# Altium footprint library Inductors SMD.PcbLib: 145 footprints (part 8 of 10)
Each footprint in its own frame and in the unit in brackets; x right, y up, seen from the top. Pads: shape width x height; smd on the part's side, far side on the other; paste and mask are expansions set on the pad; w line width, h text height; cw(c..) or ccw(c..) is an arc to the next point about the centre after c.
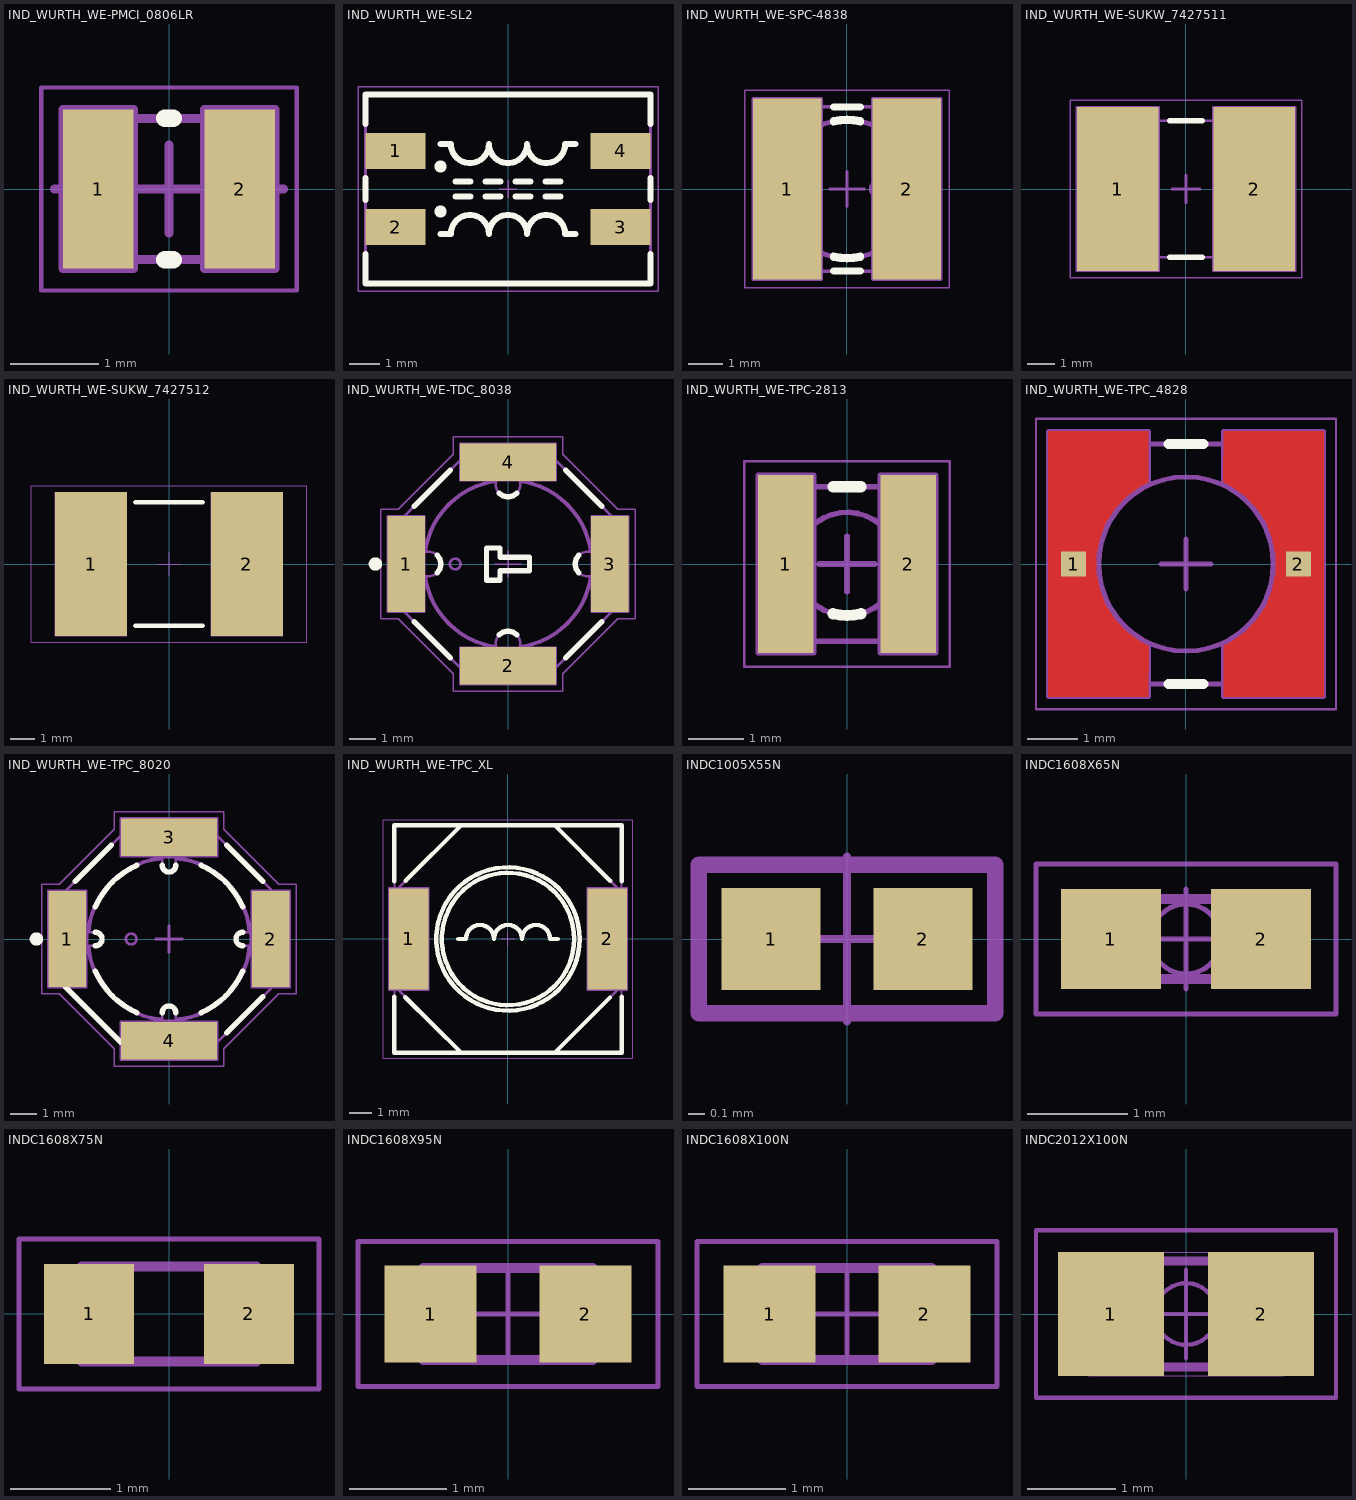
[diagram p7: the footprints below, top view; thin cyan lines are the x and y axes]

## IND_WURTH_WE-PMCI_0806LR [mm] "SMD Power Molded Chip  Inductor (WE-PMCI Series), Body 2.0x1.6mm"
height 1
pads (2):
  rect 0.8x1.8 smd: 1(-0.8,0) 2(0.8,0)
Top Overlay:
  lines w0.2: -0.05,-0.8 0.05,-0.8 ; -0.05,0.8 0.05,0.8
Mechanical 8:
  lines w0.1: -1.3,0 -0.8,0 ; -0.8,-0.5 -0.8,0 ; -0.8,0.5 -0.8,0 ; -0.5,0 0,0 ; -0.3,0 -0.8,0 ; 0,-0.5 0,0 ; 0,0.5 0,0 ; 0.3,0 0.8,0 ; 0.5,0 0,0 ; 0.8,-0.5 0.8,0 ; 0.8,0.5 0.8,0 ; 1.3,0 0.8,0 ; -1.2,-0.9 -0.4,-0.9 -0.4,0.9 -1.2,0.9 -1.2,-0.9 ; 0.4,-0.9 1.2,-0.9 1.2,0.9 0.4,0.9 0.4,-0.9
Mechanical 14:
  lines w0.1: -0.5,-0.8 0.5,-0.8 ; -0.5,-0.8 -1,-0.8 -1,0.8 -0.5,0.8 ; -0.5,-0.8 -0.5,0.8 ; -0.5,0.8 0.5,0.8 ; 0.5,-0.8 0.5,0.8 ; 0.5,-0.8 1,-0.8 1,0.8 0.5,0.8
Mechanical 15:
  lines w0.05: -1.45,-1.15 1.45,-1.15 1.45,1.15 -1.45,1.15 -1.45,-1.15
3D body "IND_WURTH_WE-PMCI_0806LR.stp": height 1, standoff 0, extent -1,-0.8 1,0.8

## IND_WURTH_WE-SL2 [mm] "Common Mode SMD Line Filter WE-SL2"
height 1.45
pads (4):
  rect 2x1.2 smd: 1(-3.75,1.27) 2(-3.75,-1.27) 3(3.75,-1.27) 4(3.75,1.27)
Top Overlay:
  circle w0.2: c-2.25,-0.75 r0.1
  circle w0.2: c-2.25,0.75 r0.1
  lines w0.2: -4.75,-2.175 -4.75,-3.15 4.75,-3.15 4.75,-2.175 ; -4.75,-0.365 -4.75,0.365 ; -4.75,2.175 -4.75,3.15 4.75,3.15 4.75,2.175 ; -2.25,-1.5 -1.905,-1.5 cw(c-1.27,-1.5) -0.635,-1.5 cw(c0,-1.5) 0.635,-1.5 cw(c1.27,-1.5) 1.905,-1.5 2.25,-1.5 ; -2.25,1.5 -1.905,1.5 ccw(c-1.27,1.5) -0.635,1.5 ccw(c0,1.5) 0.635,1.5 ccw(c1.27,1.5) 1.905,1.5 2.25,1.5 ; -1.75,-0.25 -1.25,-0.25 ; -1.75,0.25 -1.25,0.25 ; -0.75,-0.25 -0.25,-0.25 ; -0.75,0.25 -0.25,0.25 ; 0.25,-0.25 0.75,-0.25 ; 0.25,0.25 0.75,0.25 ; 1.25,-0.25 1.75,-0.25 ; 1.25,0.25 1.75,0.25 ; 4.75,-0.365 4.75,0.365
Mechanical 14:
  circle w0.1: c-2.25,-0.75 r0.1
  circle w0.1: c-2.25,0.75 r0.1
  lines w0.1: -2.25,-1.5 -1.905,-1.5 cw(c-1.27,-1.5) -0.635,-1.5 cw(c0,-1.5) 0.635,-1.5 cw(c1.27,-1.5) 1.905,-1.5 2.25,-1.5 ; -2.25,1.5 -1.905,1.5 ccw(c-1.27,1.5) -0.635,1.5 ccw(c0,1.5) 0.635,1.5 ccw(c1.27,1.5) 1.905,1.5 2.25,1.5 ; -1.75,-0.25 -1.25,-0.25 ; -1.75,0.25 -1.25,0.25 ; -0.75,-0.25 -0.25,-0.25 ; -0.75,0.25 -0.25,0.25 ; 0.25,-0.25 0.75,-0.25 ; 0.25,0.25 0.75,0.25 ; 1.25,-0.25 1.75,-0.25 ; 1.25,0.25 1.75,0.25 ; -4.75,-3.15 -4.75,3.15 4.75,3.15 4.75,-3.15 -4.75,-3.15
Mechanical 15:
  lines w0.05: -0.3,0 0.3,0 ; 0,-0.3 0,0.3 ; -5,-3.4 -5,3.4 5,3.4 5,-3.4 -5,-3.4
3D body "IND_WURTH_WE-SL2.stp": height 5.3, standoff 0, extent -4.749,-3.149 4.751,3.151

## IND_WURTH_WE-SPC-4838 [mm] "SMD Inductor, Body 4.8x4.8mm"
height 9.1
pads (2):
  rect 2x5.3 smd: 1(-1.75,0) 2(1.75,0)
Top Overlay:
  lines w0.2: -0.4,-2.41 0.4,-2.41 ; -0.4,-2.011 ccw(c0,0) 0.4,-2.011 ; -0.4,-1.96 ccw(c0,0) 0.4,-1.96 ; -0.4,1.96 cw(c0,0) 0.4,1.96 ; -0.4,2.011 cw(c0,0) 0.4,2.011 ; -0.4,2.41 0.4,2.41
Mechanical 8:
  lines w0.1: -2.25,0 -1.75,0 ; -1.75,-0.5 -1.75,0 ; -1.75,0.5 -1.75,0 ; -1.25,0 -1.75,0 ; -0.5,0 0,0 ; 0,-0.5 0,0 ; 0,0.5 0,0 ; 0.5,0 0,0 ; 1.25,0 1.75,0 ; 1.75,-0.5 1.75,0 ; 1.75,0.5 1.75,0 ; 2.25,0 1.75,0 ; -2.75,-2.65 -2.75,2.65 -0.75,2.65 -0.75,-2.65 -2.75,-2.65 ; 0.75,-2.65 0.75,2.65 2.75,2.65 2.75,-2.65 0.75,-2.65
Mechanical 14:
  circle w0.1: c0.944,0 r0.25
  circle w0.1: c0,0 r2.05
  lines w0.1: -2.41,-2.21 ccw(c-2.21,-2.21) -2.21,-2.41 1.2,-2.41 ccw(c1.2,-1.9) 1.671,-2.096 cw(c2.4,-2.4) 2.096,-1.671 ccw(c1.9,-1.2) 2.41,-1.2 2.41,2.21 ccw(c2.21,2.21) 2.21,2.41 -1.2,2.41 ccw(c-1.2,1.9) -1.671,2.096 cw(c-2.4,2.4) -2.096,1.671 ccw(c-1.9,1.2) -2.41,1.2 -2.41,-2.21 ; -1.751,-0.966 cw(c0,0) 0.966,1.751 cw(c0.869,1.576) 1.011,1.435 ccw(c1.202,1.203) 1.414,0.99 cw(c1.575,0.867) 1.751,0.966 cw(c0,0) -0.966,-1.751 cw(c-0.867,-1.575) -0.99,-1.414 ccw(c-1.202,-1.202) -1.414,-0.99 cw(c-1.575,-0.867) -1.751,-0.966
Mechanical 15:
  lines w0.05: -3,-2.9 -3,2.9 3,2.9 3,-2.9 -3,-2.9
3D body "IND_WURTH_WE-SPC-4838.stp": height 3.81, standoff 0, extent -2.41,-2.41 2.41,2.41

## IND_WURTH_WE-SUKW_7427511 [mm] "WE-SUKW SMD EMI Suppression 5-Hole Ferrite Bead, Body 8x5mm"
height 5.1
pads (2):
  rect 3x6 smd: 1(-2.5,0) 2(2.5,0)
Top Overlay:
  lines w0.2: -0.6,-2.5 0.6,-2.5 ; -0.6,2.5 0.6,2.5
Mechanical 8:
  lines w0.1: -3,0 -2.5,0 ; -2.5,-0.5 -2.5,0 ; -2.5,0.5 -2.5,0 ; -2,0 -2.5,0 ; -0.5,0 0,0 ; 0,-0.5 0,0 ; 0,0.5 0,0 ; 0.5,0 0,0 ; 2,0 2.5,0 ; 2.5,-0.5 2.5,0 ; 2.5,0.5 2.5,0 ; 3,0 2.5,0 ; -4,-3 -4,3 -1,3 -1,-3 -4,-3 ; 1,-3 1,3 4,3 4,-3 1,-3
Mechanical 14:
  drawing of 3064 lines, arcs and shapes, not listed
Mechanical 15:
  lines w0.05: -4.25,-3.25 4.25,-3.25 4.25,3.25 -4.25,3.25 -4.25,-3.25
3D body "IND_WURTH_WE-SUKW_7427511.stp": height 4.85, standoff 0, extent -4,-2.625 4,2.625

## IND_WURTH_WE-SUKW_7427512 [mm] "WE-SUKW SMD EMI Suppression 5-Hole Ferrite Bead, Body 11x4.65mm"
height 5.5
pads (2):
  rect 3x6 smd: 1(-3.25,0) 2(3.25,0)
Top Overlay:
  lines w0.2: -1.4,-2.575 1.4,-2.575 ; -1.4,2.575 1.4,2.575
Mechanical 8:
  lines w0.05: -3.75,0 -3.25,0 ; -3.25,-0.5 -3.25,0 ; -3.25,0.5 -3.25,0 ; -2.75,0 -3.25,0 ; -0.5,0 0,0 ; 0,-0.5 0,0 ; 0,0.5 0,0 ; 0.5,0 0,0 ; 2.75,0 3.25,0 ; 3.25,-0.5 3.25,0 ; 3.25,0.5 3.25,0 ; 3.75,0 3.25,0 ; -4.75,-3 -1.75,-3 -1.75,3 -4.75,3 -4.75,-3 ; 1.75,-3 4.75,-3 4.75,3 1.75,3 1.75,-3
Mechanical 15:
  lines w0.05: -5.75,-3.25 -5.75,3.25 5.75,3.25 5.75,-3.25 -5.75,-3.25
3D body "IND_WURTH_WE-SUKW_7427512.stp": height 5.25, standoff 0, extent -5.499,-2.575 5.5,2.575

## IND_WURTH_WE-TDC_8038 [mm] "Common Mode SMD, Shielded Coupled Inductor (WE-TDC Serie), Body 8x8mm H 4.1mm"
height 4.1
pads (4):
  rect 1.4x3.6 smd: 1(-3.8,0) 3(3.8,0)
  rect 3.6x1.4 smd: 2(0,-3.8) 4(0,3.8)
Top Overlay:
  circle w0.25: c-4.95,0 r0.125
  lines w0.2: -3.507,-2.15 -2.15,-3.507 ; -3.507,2.15 -2.15,3.507 ; -2.645,-0.327 ccw(c-2.972,0) -2.645,0.327 ; -0.327,-2.645 cw(c0,-2.972) 0.327,-2.645 ; -0.327,2.645 ccw(c0,2.972) 0.327,2.645 ; 2.15,-3.507 3.507,-2.15 ; 2.15,3.507 3.507,2.15 ; 2.645,-0.327 cw(c2.972,0) 2.645,0.327 ; -0.8,-0.6 -0.8,0.6 -0.3,0.6 -0.3,0.25 0.8,0.25 0.8,-0.25 -0.3,-0.25 -0.3,-0.6 -0.8,-0.6
Mechanical 8:
  lines w0.05: -4.3,0 -3.8,0 ; -3.8,-0.5 -3.8,0 ; -3.8,0.5 -3.8,0 ; -3.3,0 -3.8,0 ; -0.5,-3.8 0,-3.8 ; -0.5,0 0,0 ; -0.5,3.8 0,3.8 ; 0,-4.3 0,-3.8 ; 0,-3.3 0,-3.8 ; 0,-0.5 0,0 ; 0,0.5 0,0 ; 0,3.3 0,3.8 ; 0,4.3 0,3.8 ; 0.5,-3.8 0,-3.8 ; 0.5,0 0,0 ; 0.5,3.8 0,3.8 ; 3.3,0 3.8,0 ; 3.8,-0.5 3.8,0 ; 3.8,0.5 3.8,0 ; 4.3,0 3.8,0 ; -4.5,-1.8 -4.5,1.8 -3.1,1.8 -3.1,-1.8 -4.5,-1.8 ; -1.8,-4.5 1.8,-4.5 1.8,-3.1 -1.8,-3.1 -1.8,-4.5 ; -1.8,3.1 1.8,3.1 1.8,4.5 -1.8,4.5 -1.8,3.1 ; 3.1,-1.8 3.1,1.8 4.5,1.8 4.5,-1.8 3.1,-1.8
Mechanical 14:
  circle w0.1: c-1.972,0 r0.2
  circle w0.1: c0,0 r3.157
  lines w0.1: -4,-1.657 -1.657,-4 1.657,-4 4,-1.657 4,1.657 1.657,4 -1.657,4 -4,1.657 -4,-1.657 ; -3.077,-0.45 ccw(c0.001,0.001) -0.45,-3.077 cw(c0,-2.972) 0.45,-3.077 ccw(c-0.001,0.001) 3.077,-0.45 cw(c2.972,0) 3.077,0.45 ccw(c-0.002,-0.002) 0.45,3.077 cw(c0,2.972) -0.45,3.077 ccw(c0.002,-0.002) -3.077,0.45 cw(c-2.972,0) -3.077,-0.45 ; -0.8,-0.6 -0.8,0.6 -0.3,0.6 -0.3,0.25 0.8,0.25 0.8,-0.25 -0.3,-0.25 -0.3,-0.6 -0.8,-0.6
Mechanical 15:
  lines w0.05: -4.75,-2.05 -4.75,2.05 -4.104,2.05 -2.05,4.104 -2.05,4.75 2.05,4.75 2.05,4.104 4.104,2.05 4.75,2.05 4.75,-2.05 4.104,-2.05 2.05,-4.104 2.05,-4.75 -2.05,-4.75 -2.05,-4.104 -4.104,-2.05 -4.75,-2.05
3D body "IND_WURTH_WE-TDC_8038.stp": height 3.8, standoff 0, extent -4,-4 4,4

## IND_WURTH_WE-TPC-2813 [mm] "Shielded Tiny Power Inductor, Body 2.8x2.8mm"
height 1.5
pads (2):
  rect 1x3.2 smd: 1(-1.1,0) 2(1.1,0)
Top Overlay:
  lines w0.2: -0.25,-0.896 ccw(c0,0) 0.25,-0.896 ; -0.25,1.39 0.25,1.39
Mechanical 8:
  lines w0.1: -1.6,0 -1.1,0 ; -1.1,-0.5 -1.1,0 ; -1.1,0.5 -1.1,0 ; -0.6,0 -1.1,0 ; -0.5,0 0,0 ; 0,-0.5 0,0 ; 0,0.5 0,0 ; 0.5,0 0,0 ; 0.6,0 1.1,0 ; 1.1,-0.5 1.1,0 ; 1.1,0.5 1.1,0 ; 1.6,0 1.1,0 ; -1.6,-1.6 -1.6,1.6 -0.6,1.6 -0.6,-1.6 -1.6,-1.6 ; 0.6,-1.6 0.6,1.6 1.6,1.6 1.6,-1.6 0.6,-1.6
Mechanical 14:
  circle w0.1: c0,0 r0.93
  lines w0.1: -1.39,-0.576 -0.576,-1.39 0.576,-1.39 1.39,-0.576 1.39,0.576 0.576,1.39 -0.576,1.39 -1.39,0.576 -1.39,-0.576
Mechanical 15:
  lines w0.05: -1.85,-1.85 1.85,-1.85 1.85,1.85 -1.85,1.85 -1.85,-1.85
3D body "IND_WURTH_WE-TPC-2813.stp": height 1.2, standoff 0, extent -1.39,-1.39 1.39,1.39

## IND_WURTH_WE-TPC_4828 [mm] "Shielded Tiny Power Inductor, Body 4.8x4.8mm"
height 2.8
pads (2):
  rect 0.5x0.5 smd: 1(-2.247,0) 2(2.247,0)
Top Layer:
  region: -2.75,-2.65 -0.75,-2.65 -0.75,-1.636 -0.902,-1.558 -1.18,-1.359 -1.416,-1.112 -1.6,-0.824 -1.727,-0.507 -1.792,-0.171 -1.792,0.171 -1.727,0.507 -1.6,0.824 -1.416,1.112 -1.18,1.359 -0.902,1.558 -0.75,1.636 -0.75,2.65 -2.75,2.65
  region: 0.75,-2.65 2.75,-2.65 2.75,2.65 0.75,2.65 0.75,1.636 0.902,1.558 1.18,1.359 1.416,1.112 1.6,0.824 1.727,0.507 1.792,0.171 1.792,-0.171 1.727,-0.507 1.6,-0.824 1.416,-1.112 1.18,-1.359 0.902,-1.558 0.75,-1.636
Top Overlay:
  lines w0.2: -0.35,-2.4 0.35,-2.4 ; -0.35,2.4 0.35,2.4
Mechanical 8:
  lines w0.1: -2.747,0 -2.247,0 ; -2.247,-0.5 -2.247,0 ; -2.247,0.5 -2.247,0 ; -1.747,0 -2.247,0 ; -0.5,0 0,0 ; 0,-0.5 0,0 ; 0,0.5 0,0 ; 0.5,0 0,0 ; 1.747,0 2.247,0 ; 2.247,-0.5 2.247,0 ; 2.247,0.5 2.247,0 ; 2.747,0 2.247,0 ; -2.75,-2.65 -0.75,-2.65 -0.75,-1.636 cw(c0,0) -0.75,1.636 -0.75,2.65 -2.75,2.65 -2.75,-2.65 ; 0.75,-2.65 2.75,-2.65 2.75,2.65 0.75,2.65 0.75,1.636 cw(c0,0) 0.75,-1.636 0.75,-2.65
Mechanical 14:
  circle w0.1: c0,0 r1.744
  lines w0.1: -2.4,-2.4 -2.4,2.4 2.4,2.4 2.4,-2.4 -2.4,-2.4
Mechanical 15:
  lines w0.05: -3,-2.9 3,-2.9 3,2.9 -3,2.9 -3,-2.9
3D body "IND_WURTH_WE-TPC-4828.stp": height 2.8, standoff 0, extent -2.4,-2.4 2.4,2.4

## IND_WURTH_WE-TPC_8020 [mm] "Power Choke Inductor, Body 8x8mm"
height 2
pads (4):
  rect 1.4x3.6 smd: 1(-3.8,0) 2(3.8,0)
  rect 3.6x1.4 smd: 3(0,3.8) 4(0,-3.8)
Top Overlay:
  circle w0.25: c-4.95,0 r0.125
  lines w0.2: -3.857,-1.8 -1.8,-3.857 ; -3.507,2.15 -2.15,3.507 ; -2.75,-1.199 ccw(c0,0) -1.199,-2.75 ; -2.75,-0.25 ccw(c-2.75,0) -2.75,0.25 ; -2.75,1.199 cw(c0,0) -1.199,2.75 ; -0.25,-2.75 cw(c0,-2.75) 0.25,-2.75 ; -0.25,2.75 ccw(c0,2.75) 0.25,2.75 ; 1.199,-2.75 ccw(c0,0) 2.75,-1.199 ; 1.199,2.75 cw(c0,0) 2.75,1.199 ; 2.15,-3.507 3.507,-2.15 ; 2.15,3.507 3.507,2.15 ; 2.75,-0.25 cw(c2.75,0) 2.75,0.25
Mechanical 8:
  lines w0.1: -4.3,0 -3.8,0 ; -3.8,-0.5 -3.8,0 ; -3.8,0.5 -3.8,0 ; -3.3,0 -3.8,0 ; -0.5,-3.8 0,-3.8 ; -0.5,0 0,0 ; -0.5,3.8 0,3.8 ; 0,-4.3 0,-3.8 ; 0,-3.3 0,-3.8 ; 0,-0.5 0,0 ; 0,0.5 0,0 ; 0,3.3 0,3.8 ; 0,4.3 0,3.8 ; 0.5,-3.8 0,-3.8 ; 0.5,0 0,0 ; 0.5,3.8 0,3.8 ; 3.3,0 3.8,0 ; 3.8,-0.5 3.8,0 ; 3.8,0.5 3.8,0 ; 4.3,0 3.8,0 ; -4.5,-1.8 -3.1,-1.8 -3.1,1.8 -4.5,1.8 -4.5,-1.8 ; -1.8,-4.5 -1.8,-3.1 1.8,-3.1 1.8,-4.5 -1.8,-4.5 ; -1.8,3.1 -1.8,4.5 1.8,4.5 1.8,3.1 -1.8,3.1 ; 3.1,-1.8 4.5,-1.8 4.5,1.8 3.1,1.8 3.1,-1.8
Mechanical 14:
  circle w0.1: c0,0 r3.05
  circle w0.1: c-1.415,0 r0.2
  lines w0.1: -4,-1.657 -4,1.657 -1.657,4 1.657,4 4,1.657 4,-1.657 1.657,-4 -1.657,-4 -4,-1.657 ; -2.99,-0.25 ccw(c0,0) -0.25,-2.99 -0.25,-2.75 cw(c0,-2.75) 0.25,-2.75 0.25,-2.99 ccw(c0,0) 2.99,-0.25 2.75,-0.25 cw(c2.75,0) 2.75,0.25 2.99,0.25 ccw(c0,0) 0.25,2.99 0.25,2.75 cw(c0,2.75) -0.25,2.75 -0.25,2.99 ccw(c0,0) -2.99,0.25 -2.75,0.25 cw(c-2.75,0) -2.75,-0.25 -2.99,-0.25
Mechanical 15:
  lines w0.05: -4.75,-2.05 -4.104,-2.05 -2.05,-4.104 -2.05,-4.75 2.05,-4.75 2.05,-4.104 4.104,-2.05 4.75,-2.05 4.75,2.05 4.104,2.05 2.05,4.104 2.05,4.75 -2.05,4.75 -2.05,4.104 -4.104,2.05 -4.75,2.05 -4.75,-2.05
3D body "IND_WURTH_WE-TPC-8020.stp": height 1.8, standoff 0, extent -4,-4 4,4

## IND_WURTH_WE-TPC_XL [mm] "Shielded Tiny Power Inductor, Body 10.3x10.3mm"
height 3.1
pads (2):
  rect 1.8x4.6 smd: 1(-4.5,0) 2(4.5,0)
Top Overlay:
  circle w0.2: c0,0 r3
  circle w0.2: c0,0 r3.25
  lines w0.2: -5.15,-2.625 -5.15,-5.15 5.15,-5.15 5.15,-2.625 ; -5.15,2.625 -5.15,5.15 5.15,5.15 5.15,2.625 ; -4.658,-2.642 -2.133,-5.15 ; -4.633,2.65 -2.133,5.15 ; -2.25,0 -1.905,0 cw(c-1.27,0) -0.635,0 cw(c0,0) 0.635,0 cw(c1.27,0) 1.905,0 2.25,0 ; 2.133,-5.15 4.625,-2.65 ; 2.133,5.15 4.629,2.646
Mechanical 8:
  lines w0.1: -5.4,-2.3 -5.4,2.3 -3.6,2.3 -3.6,-2.3 -5.4,-2.3 ; 3.6,-2.3 3.6,2.3 5.4,2.3 5.4,-2.3 3.6,-2.3
Mechanical 14:
  circle w0.1: c0,0 r3.25
  circle w0.1: c0,0 r3
  lines w0.1: -5.15,-2.133 -2.133,-5.15 ; -5.15,2.133 -2.133,5.15 ; -2.25,0 -1.905,0 cw(c-1.27,0) -0.635,0 cw(c0,0) 0.635,0 cw(c1.27,0) 1.905,0 2.25,0 ; 2.133,-5.15 5.15,-2.133 ; 2.133,5.15 5.15,2.133 ; -5.15,-5.15 5.15,-5.15 5.15,5.15 -5.15,5.15 -5.15,-5.15
Mechanical 15:
  lines w0.05: -0.3,0 0.3,0 ; 0,-0.3 0,0.3 ; -5.65,-5.4 5.65,-5.4 5.65,5.4 -5.65,5.4 -5.65,-5.4
3D body "IND_WURTH_WE-TPC-XL.stp": height 3.1, standoff 0, extent -5.155,-5.155 5.145,5.145

## INDC1005X55N [mm] "Chip Inductor, 2-Leads, EIA 0402, Metric 1005, Body 1x0.5mm, 0402IPC Medium Density"
height 0.55
pads (2):
  rect 0.6x0.62 smd: 1(-0.46,0) 2(0.46,0)
Mechanical 14:
  lines w0.1: -0.9,-0.45 0.9,-0.45 0.9,0.45 -0.9,0.45 -0.9,-0.45
Mechanical 15:
  lines w0.05: -0.5,0 0.5,0 ; 0,-0.5 0,0.5 ; -0.91,-0.46 0.91,-0.46 0.91,0.46 -0.91,0.46 -0.91,-0.46
3D body "INDC1005X55N.stp": height 0.55, standoff 0, extent -0.525,-0.275 0.525,0.275

## INDC1608X65N [mm] "Chip Inductor, 2-Leads, EIA 0603, Metric 1608, Body 1.6x0.8mm, IPC Medium Density"
height 0.65
pads (2):
  rect 1x1 smd: 1(-0.75,0) 2(0.75,0)
Mechanical 14:
  lines w0.1: -0.8,-0.4 -0.8,0.4 0.8,0.4 0.8,-0.4 -0.8,-0.4
Mechanical 15:
  circle w0.05: c0,0 r0.35
  lines w0.05: -0.5,0 0.5,0 ; 0,-0.5 0,0.5 ; -1.5,-0.75 -1.5,0.75 1.5,0.75 1.5,-0.75 -1.5,-0.75
3D body "INDC1608X65N.stp": height 0.65, standoff 0, extent -0.875,-0.475 0.875,0.475

## INDC1608X75N [mm] "Chip Inductor, 2-Leads, EIA 0603, Metric 1608, Body 1.6x0.8mm, IPC Medium Density"
height 0.75
pads (2):
  rect 0.9x1 smd: 1(-0.8,0) 2(0.8,0)
Mechanical 8:
  lines w0.025: -0.575,-0.475 -0.575,0.475 ; 0.575,-0.475 0.575,0.475 ; -0.875,-0.475 0.875,-0.475 0.875,0.475 -0.875,0.475 -0.875,-0.475
Mechanical 14:
  lines w0.1: -0.875,-0.475 -0.875,0.475 0.875,0.475 0.875,-0.475 -0.875,-0.475
Mechanical 15:
  lines w0.05: -1.5,-0.75 -1.5,0.75 1.5,0.75 1.5,-0.75 -1.5,-0.75
3D body "INDC1608X75N.stp": height 0.7, standoff -0.05, extent -0.875,-0.475 0.875,0.475

## INDC1608X95N [mm] "Chip Inductor, 2-Leads, EIA 0603, Metric 1608, Body 1.6x0.8mm, IPC Medium Density"
height 0.95
pads (2):
  rect 0.95x1 smd: 1(-0.8,0) 2(0.8,0)
Mechanical 14:
  lines w0.1: -0.875,-0.475 0.875,-0.475 0.875,0.475 -0.875,0.475 -0.875,-0.475
Mechanical 15:
  lines w0.05: -0.5,0 0.5,0 ; 0,-0.5 0,0.5 ; -1.55,-0.75 1.55,-0.75 1.55,0.75 -1.55,0.75 -1.55,-0.75
3D body "INDC1608X95N.stp": height 0.95, standoff -0.05, extent -0.875,-0.475 0.875,0.475

## INDC1608X100N [mm] "Chip Inductor, 2-Leads, EIA 0603, Metric 1608, Body 1.6x0.8mm, IPC Medium Density"
height 1
pads (2):
  rect 0.95x1 smd: 1(-0.8,0) 2(0.8,0)
Mechanical 14:
  lines w0.1: -0.875,-0.475 -0.875,0.475 0.875,0.475 0.875,-0.475 -0.875,-0.475
Mechanical 15:
  lines w0.05: -0.5,0 0.5,0 ; 0,-0.5 0,0.5 ; -1.55,-0.75 -1.55,0.75 1.55,0.75 1.55,-0.75 -1.55,-0.75
3D body "INDC1608X100N.stp": height 1, standoff -0.05, extent -0.875,-0.475 0.875,0.475

## INDC2012X100N [mm] "Chip Inductor, EIA 0805, Metric 2012, Body 2.0x1.20mm, IPC Medium Density"
height 1
pads (2):
  rect 1.2x1.4 smd: 1(-0.85,0) 2(0.85,0)
Mechanical 8:
  lines w0.001: -1.1,-0.7 1.1,-0.7 1.1,0.7 -1.1,0.7 -1.1,-0.7
Mechanical 14:
  lines w0.1: -1,-0.6 1,-0.6 1,0.6 -1,0.6 -1,-0.6
Mechanical 15:
  circle w0.05: c0,0 r0.35
  lines w0.05: -0.5,0 0.5,0 ; 0,-0.5 0,0.5 ; -1.7,-0.95 1.7,-0.95 1.7,0.95 -1.7,0.95 -1.7,-0.95
3D body "INDC2012X100N.stp": height 1, standoff 0, extent -1,-0.625 1,0.625